# Altium footprint library custom_parts_old.PcbLib: 27 footprints (part 2 of 2)
Each footprint in its own frame and in the unit in brackets; x right, y up, seen from the top. Pads: shape width x height; smd on the part's side, far side on the other; paste and mask are expansions set on the pad; w line width, h text height; cw(c..) or ccw(c..) is an arc to the next point about the centre after c.
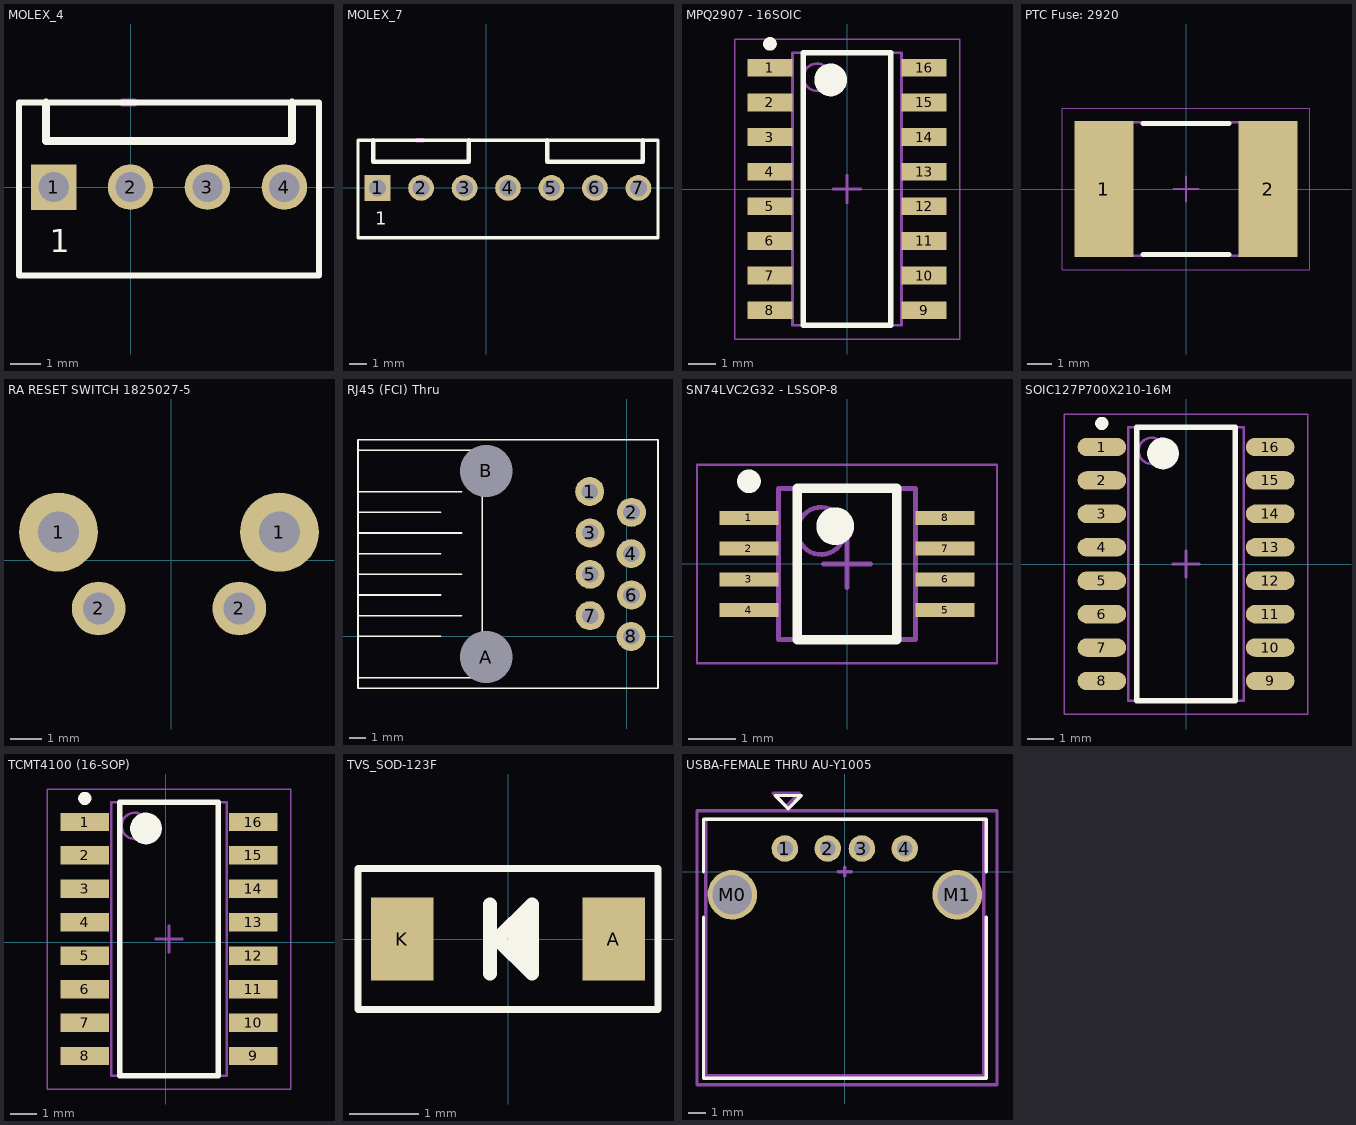
[diagram p1: the footprints below, top view; thin cyan lines are the x and y axes]

## MOLEX_4 [mm] "Connector; Header; 2 Position"
pads (4):
  rect 1.5x1.5 hole 1: 1(-2.54,0)
  round 1.5 hole 1: 2(0,0) 3(2.54,0) 4(5.08,0)
Top Overlay:
  lines w0.2: -3.683,-2.921 6.223,-2.921 6.223,2.794 -3.683,2.794 -3.683,-2.921
  lines w0.254: -2.794,2.794 -2.794,1.524 5.334,1.524 5.334,2.794
  text "1" at -2.667,-2.159 h0.76
Mechanical 1:
  lines w0.254: -0.254,2.794 0.127,2.794
3D body "022272041.stp": height 11.64, standoff -3.62, extent -3.81,-2.879 6.35,2.921

## MOLEX_7 [mm] "Connector; Header; 2 Position"
pads (7):
  rect 1.5x1.5 hole 1: 1(-6.35,0)
  round 1.5 hole 1: 2(-3.81,0) 3(-1.27,0) 4(1.27,0) 5(3.81,0) 6(6.35,0) 7(8.89,0)
Top Overlay:
  lines w0.2: -7.493,-2.921 -7.493,2.794 10.033,2.794 10.033,-2.921 -7.493,-2.921
  lines w0.254: -6.604,2.794 -6.604,1.524 -1.016,1.524 -1.016,2.794 ; 3.556,2.794 3.556,1.524 9.144,1.524 9.144,2.794
  text "1" at -6.477,-2.159 h0.76
Mechanical 1:
  lines w0.254: -4.064,2.794 -3.683,2.794
3D body "022272071.stp": height 11.64, standoff -3.62, extent -7.62,-2.879 10.16,2.921

## MPQ2907 - 16SOIC [mm] "SOIC, 16-Leads, Body 9.90x3.90mm, Pitch 1.27mm, IPC Low Density"
height 1.76
pads (16):
  rect 1.65x0.65 smd: 1(-2.825,4.445) 2(-2.825,3.175) 3(-2.825,1.905) 4(-2.825,0.635) 5(-2.825,-0.635) 6(-2.825,-1.905) 7(-2.825,-3.175) 8(-2.825,-4.445) 9(2.825,-4.445) 10(2.825,-3.175) 11(2.825,-1.905) 12(2.825,-0.635) 13(2.825,0.635) 14(2.825,1.905) 15(2.825,3.175) 16(2.825,4.445)
Top Overlay:
  circle w0.6: c-0.6,4 r0.3
  circle w0.25: c-2.825,5.32 r0.125
  lines w0.2: -1.6,-5 1.6,-5 1.6,5 -1.6,5 -1.6,-5
Mechanical 13:
  circle w0.1: c-1.1,4.1 r0.5
  lines w0.1: -2,-5 2,-5 2,5 -2,5 -2,-5
Mechanical 15:
  lines w0.05: -4.125,-5.5 4.125,-5.5 4.125,5.5 -4.125,5.5 -4.125,-5.5
  lines w0.1: -0.5,0 0.5,0 ; 0,-0.5 0,0.5
3D body: height 1.76, standoff 0.1, extent -2,-5 2,5

## PTC Fuse: 2920 [mm] "Chip Resistor, 2-Leads, Body 7.36x5.12mm, IPC Low Density"
height 1
pads (2):
  rect 2.4x5.55 smd: 1(-3.35,0) 2(3.35,0)
Top Overlay:
  lines w0.2: -1.75,-2.675 1.75,-2.675 ; -1.75,2.675 1.75,2.675
Mechanical 13:
  lines w0.1: -3.99,-2.72 3.99,-2.72 3.99,2.72 -3.99,2.72 -3.99,-2.72
Mechanical 15:
  lines w0.05: -5.05,-3.3 5.05,-3.3 5.05,3.3 -5.05,3.3 -5.05,-3.3
  lines w0.1: -0.5,0 0.5,0 ; 0,-0.5 0,0.5
3D body: height 1, standoff 0, extent 3.14,-2.72 3.99,2.72
3D body: height 1, standoff 0, extent -3.99,-2.72 -3.14,2.72
3D body: height 1, standoff 0, extent -3.14,-2.72 3.14,2.72

## RA RESET SWITCH 1825027-5 [mm]
pads (4):
  round 2.5 hole 1.3: 1(-3.556,0.889) 1(3.429,0.889)
  round 1.7 hole 1: 2(-2.286,-1.524) 2(2.159,-1.524)
3D body "c-1825027-5-g1-3d.stp": height 7.2, standoff -3.32, extent -4.204,-5.448 4.204,2.413

## RJ45 (FCI) Thru [mil]
pads (10):
  round 70 hole 40: 1(-90,350) 2(11,300) 3(-89,250) 4(10,200) 5(-89,150) 6(11,100) 7(-89,50) 8(10,0)
  round 110 hole 125.98 unplated: A(-340,-50) B(-340,400)
Top Overlay:
  lines w4: -650,-100 -400,-100 -350,-100 -350,450 -650,450 ; -650,0 -450,0 ; -650,50 -400,50 ; -650,100 -450,100 ; -650,150 -400,150 ; -650,200 -450,200 ; -650,250 -400,250 ; -650,300 -450,300 ; -650,350 -400,350 ; -100,475 75,475 ; 75,75 75,475 ; 75,475 75,-125 -650,-125 -650,475 75,475
3D body "7499010004A.stp": height 540.16, standoff -122.83, extent -778.74,-140.74 71.26,490.76

## SN74LVC2G32 - LSSOP-8 [mm] "TSOP, 8-Leads, Body 2.95x2.80mm, Pitch 0.65mm, IPC Low Density"
height 1.3
pads (8):
  rect 1.25x0.3 smd: 1(-2.075,0.975) 2(-2.075,0.325) 3(-2.075,-0.325) 4(-2.075,-0.975) 5(2.075,-0.975) 6(2.075,-0.325) 7(2.075,0.325) 8(2.075,0.975)
Top Overlay:
  circle w0.25: c-2.075,1.75 r0.125
  circle w0.4: c-0.25,0.8 r0.2
  lines w0.2: -1.05,-1.6 -1.05,1.6 1.05,1.6 1.05,-1.6 -1.05,-1.6
Mechanical 13:
  circle w0.1: c-0.55,0.7 r0.5
  lines w0.1: -1.45,-1.6 -1.45,1.6 1.45,1.6 1.45,-1.6 -1.45,-1.6
Mechanical 15:
  lines w0.05: -3.175,-2.1 -3.175,2.1 3.175,2.1 3.175,-2.1 -3.175,-2.1
  lines w0.1: -0.5,0 0.5,0 ; 0,-0.5 0,0.5
3D body: height 1.3, standoff 0.1, extent -1.45,-1.6 1.45,1.6

## SOIC127P700X210-16M [mm] "SOIC, 16-Leads, Body 10.40x4.40mm, Pitch 1.27mm, IPC Low Density"
height 2.1
pads (16):
  oval 1.85x0.7 smd: 1(-3.2,4.445) 2(-3.2,3.175) 3(-3.2,1.905) 4(-3.2,0.635) 5(-3.2,-0.635) 6(-3.2,-1.905) 7(-3.2,-3.175) 8(-3.2,-4.445) 9(3.2,-4.445) 10(3.2,-3.175) 11(3.2,-1.905) 12(3.2,-0.635) 13(3.2,0.635) 14(3.2,1.905) 15(3.2,3.175) 16(3.2,4.445)
Top Overlay:
  circle w0.25: c-3.2,5.345 r0.125
  circle w0.6: c-0.875,4.2 r0.3
  lines w0.2: -1.875,-5.2 -1.875,5.2 1.875,5.2 1.875,-5.2 -1.875,-5.2
Mechanical 13:
  circle w0.1: c-1.3,4.3 r0.5
  lines w0.1: -2.2,-5.2 -2.2,5.2 2.2,5.2 2.2,-5.2 -2.2,-5.2
Mechanical 15:
  lines w0.05: -4.625,-5.7 -4.625,5.7 4.625,5.7 4.625,-5.7 -4.625,-5.7
  lines w0.1: -0.5,0 0.5,0 ; 0,-0.5 0,0.5
3D body: height 2.1, standoff 0.1, extent -2.2,-5.2 2.2,5.2

## TCMT4100 (16-SOP) [mm]
pads (16):
  rect 1.85x0.7 smd: 1(-3.073,4.572) 2(-3.073,3.302) 3(-3.073,2.032) 4(-3.073,0.762) 5(-3.073,-0.508) 6(-3.073,-1.778) 7(-3.073,-3.048) 8(-3.073,-4.318) 9(3.327,-4.318) 10(3.327,-3.048) 11(3.327,-1.778) 12(3.327,-0.508) 13(3.327,0.762) 14(3.327,2.032) 15(3.327,3.302) 16(3.327,4.572)
Top Overlay:
  circle w0.25: c-3.073,5.472 r0.125
  circle w0.6: c-0.748,4.327 r0.3
  lines w0.2: -1.748,-5.073 -1.748,5.327 2.002,5.327 2.002,-5.073 -1.748,-5.073
Mechanical 13:
  circle w0.1: c-1.173,4.427 r0.5
  lines w0.1: -2.073,-5.073 -2.073,5.327 2.327,5.327 2.327,-5.073 -2.073,-5.073
Mechanical 15:
  lines w0.05: -4.498,-5.573 -4.498,5.827 4.752,5.827 4.752,-5.573 -4.498,-5.573
  lines w0.1: -0.373,0.127 0.627,0.127 ; 0.127,-0.373 0.127,0.627
3D body: height 2.1, standoff 0.1, extent -2.073,-5.073 2.327,5.327

## TVS_SOD-123F [mm]
pads (2):
  rect 0.9x1.2 smd: A(1.524,0) K(-1.524,0)
Top Overlay:
  lines w0.102: -2.159,-1.016 2.159,-1.016 2.159,1.016 -2.159,1.016 -2.159,-1.016
  lines w0.2: -0.257,-0.5 -0.257,0.5 ; 0.093,-0.15 0.093,0.15 ; 0.243,-0.3 0.243,0.3 ; -0.157,0 0.343,0.5 0.343,-0.5 -0.157,0
3D body: height 0.79, standoff 0.74, extent -1.049,-0.75 -0.924,0.75
3D body: height 0.7, standoff 0, extent -1.511,-0.25 -1.386,0.25
3D body: height 0.7, standoff 0.5, extent -1.399,-0.25 -1.299,0.25
3D body: height 0.2, standoff 0, extent -1.699,-0.25 -1.499,0.25
3D body: height 0.76, standoff 0, extent -1.299,-0.875 1.376,0.875
3D body: height 0.2, standoff 0, extent 1.576,-0.225 1.776,0.275
3D body: height 0.7, standoff 0.5, extent 1.376,-0.225 1.476,0.275
3D body: height 0.7, standoff 0, extent 1.463,-0.225 1.588,0.275

## USBA-FEMALE THRU AU-Y1005 [mm] "THT, USB 2.0 A Connector, 4Pin, Body 15.8 x14.5mm"
height 7.12
pads (6):
  round 1.55 hole 0.92: 1(-3.5,1.35) 2(-1,1.35) 3(1,1.35) 4(3.5,1.35)
  round 2.9 hole 2.3: M0(-6.57,-1.35) M1(6.57,-1.35)
Top Overlay:
  lines w0.2: -8.255,-2.667 -8.255,-12.065 8.255,-12.065 8.255,-2.667 ; -8.255,0 -8.255,3.048 8.255,3.048 8.255,0 ; -4.064,4.445 -3.302,3.683 -2.54,4.445 -4.064,4.445
Mechanical 13:
  lines w0.2: -8.128,-11.938 -8.128,3.048 8.128,3.048 8.128,-11.938 -8.128,-11.938
Mechanical 15:
  lines w0.2: -0.381,0 0.381,0 ; 0,-0.254 0,0.254 ; -8.636,-12.446 -8.636,3.556 8.89,3.556 8.89,-12.446 -8.636,-12.446 ; -4.191,4.572 -2.667,4.572 -3.429,3.81 -4.191,4.572
  text ".Designator" at 0,0 h0.76
3D body "WE-EPLE_8492121_1.stp": height 7.8, standoff -3.49, extent -7.892,-11.698 7.873,2.802